# Altium footprint library goldpin_pcb.PcbLib: 235 footprints (part 2 of 15)
Each footprint in its own frame and in the unit in brackets; x right, y up, seen from the top. Pads: shape width x height; smd on the part's side, far side on the other; paste and mask are expansions set on the pad; w line width, h text height; cw(c..) or ccw(c..) is an arc to the next point about the centre after c.
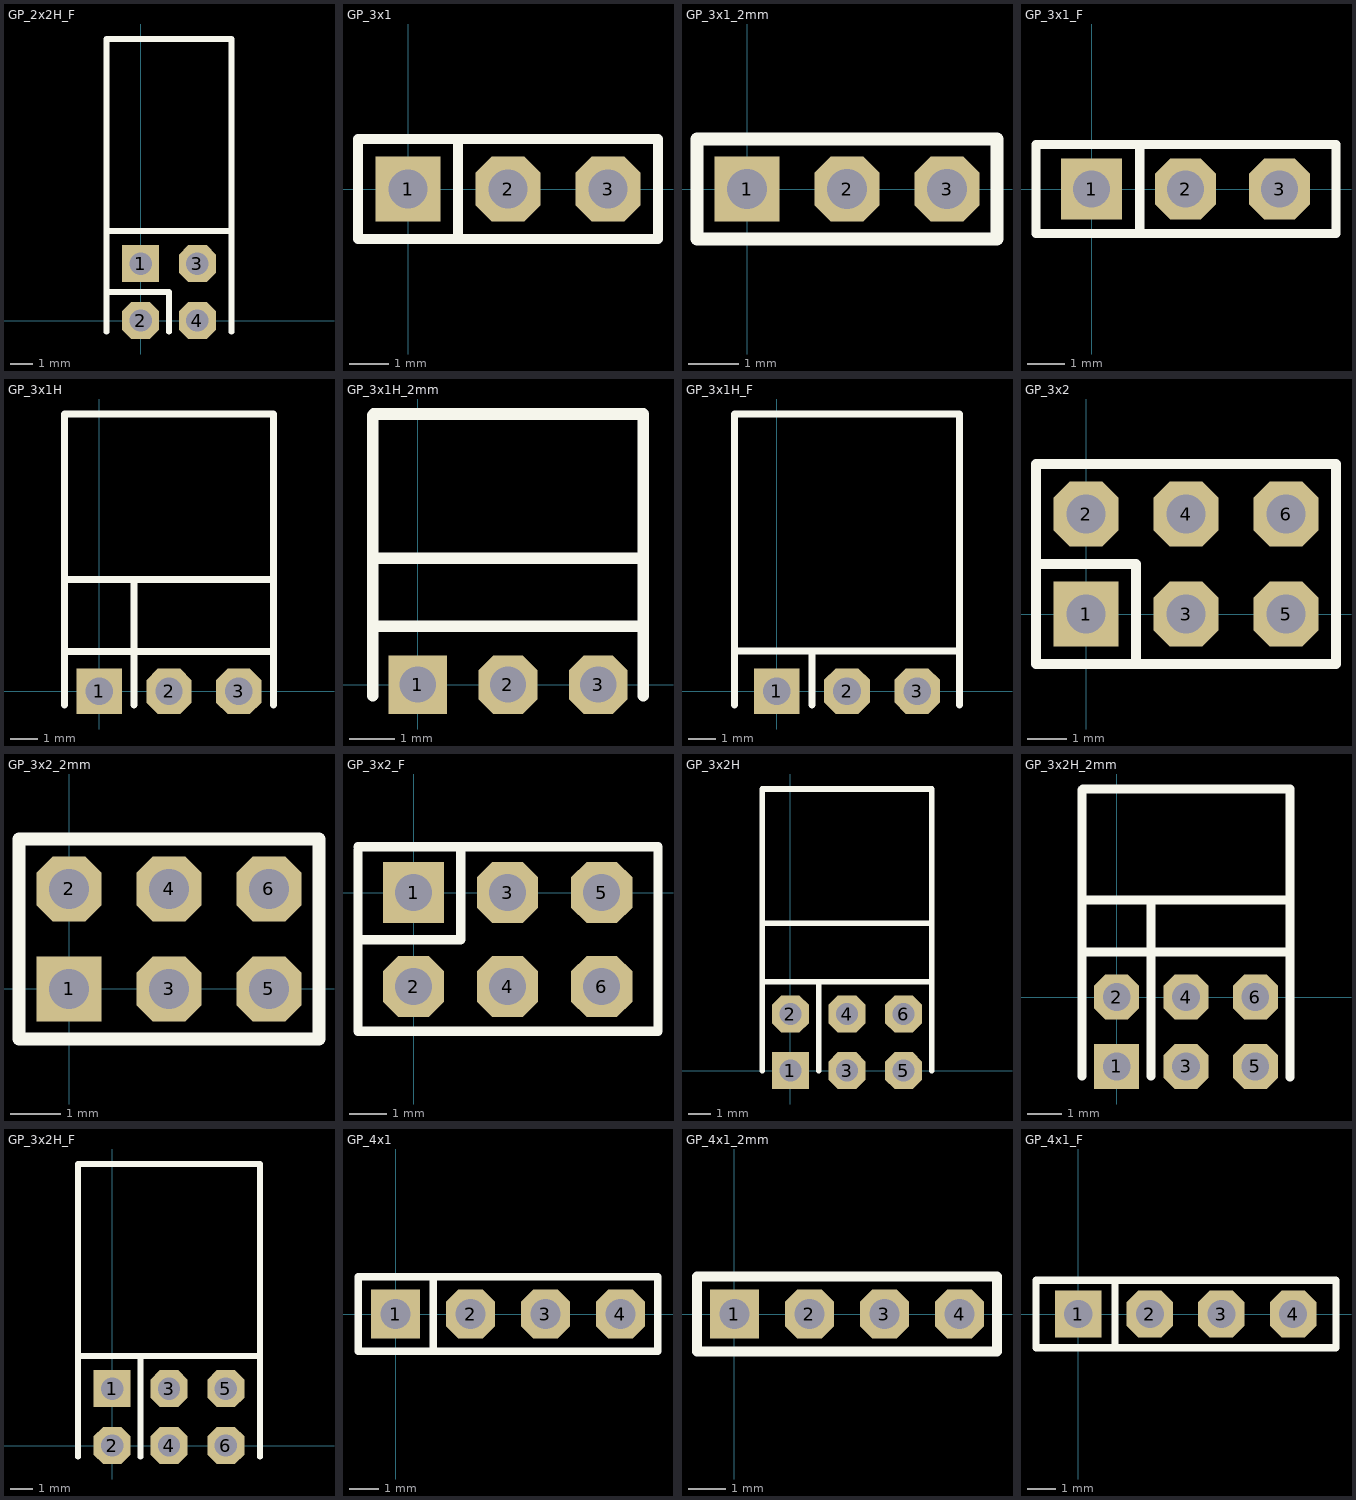
[diagram p1: the footprints below, top view; thin cyan lines are the x and y axes]

## GP_2x2H_F [mil]
pads (4):
  rect 65x65 hole 39.37: 1(0,100)
  oct 65x65 hole 39.37: 2(0,0) 3(100,100) 4(100,0)
Top Overlay:
  lines w10: -60,-20 -60,495 160,495 160,-20 ; -60,50 50,50 50,-20 ; -60,157.24 160,157.24
3D body: height 197.89, standoff -97.11, extent -60,-10 160,493

## GP_3x1 [mil]
pads (3):
  rect 65x65 hole 39.37: 1(0,0)
  oct 65x65 hole 39.37: 2(100,0) 3(200,0)
Top Overlay:
  lines w10: 50,-50 50,50 ; -50,-50 250,-50 250,50 -50,50 -50,-19.68 -50,-50
3D body: height 330, standoff -115, extent -50,-50 250,50

## GP_3x1_2mm [mm]
height 4.45
pads (3):
  rect 1.3x1.3 hole 0.8: 1(0,0)
  oct 1.3x1.3 hole 0.8: 2(2,0) 3(4,0)
Top Overlay:
  lines w0.254: -1,-1 5,-1 5,1 -1,1 -1,-1
3D body: height 5.51, standoff -2.69, extent -1,-0.99 5,0.991

## GP_3x1_F [mil]
pads (3):
  rect 65x65 hole 39.37: 1(0,0)
  oct 65x65 hole 39.37: 2(100,0) 3(200,0)
Top Overlay:
  lines w10: 51.18,-47.24 51.18,47.24 ; -59.06,-47.24 -59.06,-10.63 -59.06,47.51 260,47.51 260,-47.24 -59.06,-47.24
3D body: height 335, standoff -104, extent -60,-47.49 260,47.51

## GP_3x1H [mil]
pads (3):
  rect 65x65 hole 39.37: 1(0,0)
  oct 65x65 hole 39.37: 2(100,0) 3(200,0)
Top Overlay:
  lines w10: -50,-19.68 -50,80.31 -50,397.64 250,397.64 250,180.31 250,-19.68 ; -50,57.24 250,57.24 ; -50,160.51 250,160.51 ; 50,-19.68 50,80.31 50,160
3D body: height 120.87, standoff -89.13, extent -49,-13 251,389.5

## GP_3x1H_2mm [mm]
height 4.45
pads (3):
  rect 1.3x1.3 hole 0.8: 1(0,0)
  oct 1.3x1.3 hole 0.8: 2(2,0) 3(4,0)
Top Overlay:
  lines w0.254: -1,-0.25 -1,1.822 -1,5.973 ; -1,1.3 5,1.3 ; -1,2.8 5,2.8
  lines w0.256: -1,5.973 -0.973,6 5,6 5,-0.25
3D body: height 1.99, standoff -3.04, extent -1,-0.25 5,5.973

## GP_3x1H_F [mil]
pads (3):
  rect 65x65 hole 39.37: 1(0,0)
  oct 65x65 hole 39.37: 2(100,0) 3(200,0)
Top Overlay:
  lines w10: -60,-20 -60,395 260,395 260,-19.68 ; -60,57.24 260,57.24 ; 50,-19.68 50,57.24
3D body: height 96.71, standoff -98.29, extent -60,-10 260,393

## GP_3x2 [mil]
pads (6):
  rect 65x65 hole 39.37: 1(0,0)
  oct 65x65 hole 39.37: 2(0,100) 3(100,0) 4(100,100) 5(200,0) 6(200,100)
Top Overlay:
  lines w10: -50,50 50,50 50,-50 ; -50,-50 -50,150 250,150 250,-50 -50,-50
3D body: height 330, standoff -115, extent -50,-50 250,150

## GP_3x2_2mm [mm]
height 4.45
pads (6):
  rect 1.3x1.3 hole 0.8: 1(0,0)
  oct 1.3x1.3 hole 0.8: 2(0,2) 3(2,0) 4(2,2) 5(4,0) 6(4,2)
Top Overlay:
  lines w0.254: -1,-1 5,-1 5,2.999 -1,2.999 -1,-1
3D body: height 6.51, standoff -1.69, extent -1,-0.968 5,2.969

## GP_3x2_F [mil]
pads (6):
  rect 65x65 hole 39.37: 1(0,0)
  oct 65x65 hole 39.37: 2(0,-100) 3(100,0) 4(100,-100) 5(200,0) 6(200,-100)
Top Overlay:
  lines w10: -59.06,-50 50,-50 50,48.45 ; -59.06,45.67 -59.06,-147.24 259.84,-147.24 259.84,48.45 -59.06,48.45
3D body: height 335, standoff -104, extent -60,-147.5 260,47.51

## GP_3x2H [mil]
pads (6):
  rect 65x65 hole 39.37: 1(0,0)
  oct 65x65 hole 39.37: 2(0,100) 3(100,0) 4(100,100) 5(200,0) 6(200,100)
Top Overlay:
  lines w10: -50,0 -50,80.31 -50,180.31 -50,497.64 250,497.64 250,180.31 250,80.31 250,0 ; -50,157.24 250,157.24 ; -50,260.51 250,260.51 ; 50,0 50,157.24
3D body: height 220.08, standoff -89.92, extent -52,-12 248,490.5

## GP_3x2H_2mm [mm]
height 4.45
pads (6):
  rect 1.3x1.3 hole 0.8: 1(0,-2)
  oct 1.3x1.3 hole 0.8: 2(0,0) 3(2,-2) 4(2,0) 5(4,-2) 6(4,0)
Top Overlay:
  lines w0.254: -1,-2.275 -1,1.822 -1,5.973 ; -1,1.3 4.975,1.3 ; -1,2.8 5,2.8 ; 0.99,-2.275 0.99,2.775 ; 5,-2.3 5,6
  lines w0.256: -1,5.973 -0.973,6 4.975,6
3D body: height 3.97, standoff -3.02, extent -1.025,-2.261 4.975,5.961

## GP_3x2H_F [mil]
pads (6):
  rect 65x65 hole 39.37: 1(0,100)
  oct 65x65 hole 39.37: 2(0,0) 3(100,100) 4(100,0) 5(200,100) 6(200,0)
Top Overlay:
  lines w10: -60,-20 -60,495 260,495 260,-20 ; -60,157.24 260,157.24 ; 50,-20 50,157.24
3D body: height 197.89, standoff -97.11, extent -60,-10 260,493

## GP_4x1 [mil]
pads (4):
  rect 65x65 hole 39.37: 1(0,0)
  oct 65x65 hole 39.37: 2(100,0) 3(200,0) 4(300,0)
Top Overlay:
  lines w10: 50,-50 50,50 ; -50,-50 -50,50 350,50 350,-50 -50,-50
3D body: height 330, standoff -115, extent -50,-50 350,50

## GP_4x1_2mm [mm]
height 4.45
pads (4):
  rect 1.3x1.3 hole 0.8: 1(0,0)
  oct 1.3x1.3 hole 0.8: 2(2,0) 3(4,0) 4(6,0)
Top Overlay:
  lines w0.254: -1,-1 -1,1 7,1 7,-1 -1,-1
3D body: height 5.51, standoff -2.69, extent -1,-0.99 7,0.991

## GP_4x1_F [mil]
pads (4):
  rect 65x65 hole 39.37: 1(0,0)
  oct 65x65 hole 39.37: 2(100,0) 3(200,0) 4(300,0)
Top Overlay:
  lines w10: 51.18,-47.24 51.18,47.24 ; -59.06,-47.24 -59.06,47.24 360,47.24 360,-47.24 -59.06,-47.24
3D body: height 335, standoff -104, extent -60,-47.49 360,47.51